# Altium schematic symbol library jlcpcb_2025_04_inductors_extended_0402.schlib: 1396 symbols (part 3 of 8) (continued)
## LQG15HS27NJ02D
designator L?  Inductance: 27nH
Inductor, 27nH, ±5%, 460mΩ, 350mA, SMD 0402; Manufacturer: Murata Electronics; Manufacturer Part Number: LQG15HS27NJ02D; Self-Resonant Frequency: 1.7GHz; Q Factor: 8@100MHz; Package Size: 0402; JLCPCB Basic Part: No; JLCPCB Part Number: C12669; Supplier 1: LCSC; Category: Inductors; Supplier Part Number 1: C12669; Tolerance: ±5%; Rated Current: 350mA; DC Resistance: 460mΩ; RoHS: Yes; ComponentLink1Description: Datasheet; ComponentLink1URL: https://wmsc.lcsc.com/wmsc/upload/file/pdf/v2/lcsc/2304140030_Murata-Electronics-LQG15HS27NJ02D_C12669.pdf; ComponentLink2Description: JLCPCB Part URL; ComponentLink2URL: https://jlcpcb.com/partdetail/C12669; ComponentLink3Description: LCSC Part URL; ComponentLink3URL: https://lcsc.com/product-detail/Inductors-SMD_Murata-Electronics-Murata-Electronics-LQG15HS27NJ02D_C12669.html
footprint IND-0402 (0402 (1005M) Inductor)
pins: 1, 2

## LQG15HS33NG02D
designator L?  Inductance: 33nH
Inductor, 33nH, ±2%, 580mΩ, 350mA, SMD 0402; Manufacturer: Murata Electronics; Manufacturer Part Number: LQG15HS33NG02D; Package Size: 0402; JLCPCB Basic Part: No; JLCPCB Part Number: C3910755; Supplier 1: LCSC; Category: Inductors; Supplier Part Number 1: C3910755; Tolerance: ±2%; Rated Current: 350mA; DC Resistance: 580mΩ; RoHS: Yes; ComponentLink1Description: Datasheet; ComponentLink1URL: https://wmsc.lcsc.com/wmsc/upload/file/pdf/v2/lcsc/2308111609_Murata-Electronics-LQG15HS33NG02D_C3910755.pdf; ComponentLink2Description: JLCPCB Part URL; ComponentLink2URL: https://jlcpcb.com/partdetail/C3910755; ComponentLink3Description: LCSC Part URL; ComponentLink3URL: https://lcsc.com/product-detail/Inductors-SMD_Murata-Electronics-Murata-Electronics-LQG15HS33NG02D_C3910755.html
footprint IND-0402 (0402 (1005M) Inductor)
pins: 1, 2

## LQG15HS33NJ02D
designator L?  Inductance: 33nH
Inductor, 33nH, ±5%, 580mΩ, 350mA, SMD 0402; Manufacturer: Murata Electronics; Manufacturer Part Number: LQG15HS33NJ02D; Self-Resonant Frequency: 1.6GHz; Q Factor: 8@100MHz; Package Size: 0402; JLCPCB Basic Part: No; JLCPCB Part Number: C86062; Supplier 1: LCSC; Category: Inductors; Supplier Part Number 1: C86062; Tolerance: ±5%; Rated Current: 350mA; DC Resistance: 580mΩ; RoHS: Yes; ComponentLink1Description: Datasheet; ComponentLink1URL: https://wmsc.lcsc.com/wmsc/upload/file/pdf/v2/lcsc/2304140030_Murata-Electronics-LQG15HS33NJ02D_C86062.pdf; ComponentLink2Description: JLCPCB Part URL; ComponentLink2URL: https://jlcpcb.com/partdetail/C86062; ComponentLink3Description: LCSC Part URL; ComponentLink3URL: https://lcsc.com/product-detail/Inductors-SMD_Murata-Electronics-Murata-Electronics-LQG15HS33NJ02D_C86062.html
footprint IND-0402 (0402 (1005M) Inductor)
pins: 1, 2

## LQG15HS39NJ02D
designator L?  Inductance: 39nH
Inductor, 39nH, ±5%, 650mΩ, 300mA, SMD 0402; Manufacturer: Murata Electronics; Manufacturer Part Number: LQG15HS39NJ02D; Self-Resonant Frequency: 1.2GHz; Q Factor: 8@100MHz; Package Size: 0402; JLCPCB Basic Part: No; JLCPCB Part Number: C86063; Supplier 1: LCSC; Category: Inductors; Supplier Part Number 1: C86063; Tolerance: ±5%; Rated Current: 300mA; DC Resistance: 650mΩ; RoHS: Yes; ComponentLink1Description: Datasheet; ComponentLink1URL: https://wmsc.lcsc.com/wmsc/upload/file/pdf/v2/lcsc/1811081612_Murata-Electronics-LQG15HS39NJ02D_C86063.pdf; ComponentLink2Description: JLCPCB Part URL; ComponentLink2URL: https://jlcpcb.com/partdetail/C86063; ComponentLink3Description: LCSC Part URL; ComponentLink3URL: https://lcsc.com/product-detail/Inductors-SMD_Murata-Electronics-Murata-Electronics-LQG15HS39NJ02D_C86063.html
footprint IND-0402 (0402 (1005M) Inductor)
pins: 1, 2

## LQG15HS47NJ02D
designator L?  Inductance: 47nH
Inductor, 47nH, ±5%, 720mΩ, 300mA, SMD 0402; Manufacturer: Murata Electronics; Manufacturer Part Number: LQG15HS47NJ02D; Self-Resonant Frequency: 1GHz; Q Factor: 8@100MHz; Package Size: 0402; JLCPCB Basic Part: No; JLCPCB Part Number: C97998; Supplier 1: LCSC; Category: Inductors; Supplier Part Number 1: C97998; Tolerance: ±5%; Rated Current: 300mA; DC Resistance: 720mΩ; RoHS: Yes; ComponentLink1Description: Datasheet; ComponentLink1URL: https://wmsc.lcsc.com/wmsc/upload/file/pdf/v2/lcsc/1811081515_Murata-Electronics-LQG15HS47NJ02D_C97998.pdf; ComponentLink2Description: JLCPCB Part URL; ComponentLink2URL: https://jlcpcb.com/partdetail/C97998; ComponentLink3Description: LCSC Part URL; ComponentLink3URL: https://lcsc.com/product-detail/Inductors-SMD_Murata-Electronics-Murata-Electronics-LQG15HS47NJ02D_C97998.html
footprint IND-0402 (0402 (1005M) Inductor)
pins: 1, 2

## LQG15HS56NJ02D
designator L?  Inductance: 56nH
Inductor, 56nH, ±5%, 820mΩ, 250mA, SMD 0402; Manufacturer: Murata Electronics; Manufacturer Part Number: LQG15HS56NJ02D; Self-Resonant Frequency: 800MHz; Q Factor: 8@100MHz; Package Size: 0402; JLCPCB Basic Part: No; JLCPCB Part Number: C162544; Supplier 1: LCSC; Category: Inductors; Supplier Part Number 1: C162544; Tolerance: ±5%; Rated Current: 250mA; DC Resistance: 820mΩ; RoHS: Yes; ComponentLink1Description: Datasheet; ComponentLink1URL: https://wmsc.lcsc.com/wmsc/upload/file/pdf/v2/lcsc/2304140030_Murata-Electronics-LQG15HS56NJ02D_C162544.pdf; ComponentLink2Description: JLCPCB Part URL; ComponentLink2URL: https://jlcpcb.com/partdetail/C162544; ComponentLink3Description: LCSC Part URL; ComponentLink3URL: https://lcsc.com/product-detail/Inductors-SMD_Murata-Electronics-Murata-Electronics-LQG15HS56NJ02D_C162544.html
footprint IND-0402 (0402 (1005M) Inductor)
pins: 1, 2

## LQG15HS68NJ02D
designator L?  Inductance: 68nH
Inductor, 68nH, ±5%, 920mΩ, 250mA, SMD 0402; Manufacturer: Murata Electronics; Manufacturer Part Number: LQG15HS68NJ02D; Self-Resonant Frequency: 800MHz; Q Factor: 8@100MHz; Package Size: 0402; JLCPCB Basic Part: No; JLCPCB Part Number: C98000; Supplier 1: LCSC; Category: Inductors; Supplier Part Number 1: C98000; Tolerance: ±5%; Rated Current: 250mA; DC Resistance: 920mΩ; RoHS: Yes; ComponentLink1Description: Datasheet; ComponentLink1URL: https://wmsc.lcsc.com/wmsc/upload/file/pdf/v2/lcsc/1811081524_Murata-Electronics-LQG15HS68NJ02D_C98000.pdf; ComponentLink2Description: JLCPCB Part URL; ComponentLink2URL: https://jlcpcb.com/partdetail/C98000; ComponentLink3Description: LCSC Part URL; ComponentLink3URL: https://lcsc.com/product-detail/Inductors-SMD_Murata-Electronics-Murata-Electronics-LQG15HS68NJ02D_C98000.html
footprint IND-0402 (0402 (1005M) Inductor)
pins: 1, 2

## LQG15HS82NJ02D
designator L?  Inductance: 82nH
Inductor, 82nH, ±5%, 1.2Ω, 200mA, SMD 0402; Manufacturer: Murata Electronics; Manufacturer Part Number: LQG15HS82NJ02D; Self-Resonant Frequency: 700MHz; Q Factor: 8@100MHz; Package Size: 0402; JLCPCB Basic Part: No; JLCPCB Part Number: C98002; Supplier 1: LCSC; Category: Inductors; Supplier Part Number 1: C98002; Tolerance: ±5%; Rated Current: 200mA; DC Resistance: 1.2Ω; RoHS: Yes; ComponentLink1Description: Datasheet; ComponentLink1URL: https://wmsc.lcsc.com/wmsc/upload/file/pdf/v2/lcsc/1811081532_Murata-Electronics-LQG15HS82NJ02D_C98002.pdf; ComponentLink2Description: JLCPCB Part URL; ComponentLink2URL: https://jlcpcb.com/partdetail/C98002; ComponentLink3Description: LCSC Part URL; ComponentLink3URL: https://lcsc.com/product-detail/Inductors-SMD_Murata-Electronics-Murata-Electronics-LQG15HS82NJ02D_C98002.html
footprint IND-0402 (0402 (1005M) Inductor)
pins: 1, 2

## LQG15HSR10H02D
designator L?  Inductance: 100nH
Inductor, 100nH, ±3%, 1.25Ω, 200mA, SMD 0402; Manufacturer: Murata Electronics; Manufacturer Part Number: LQG15HSR10H02D; Self-Resonant Frequency: 600MHz; Q Factor: 8@100MHz; Package Size: 0402; JLCPCB Basic Part: No; JLCPCB Part Number: C883578; Supplier 1: LCSC; Category: Inductors; Supplier Part Number 1: C883578; Tolerance: ±3%; Rated Current: 200mA; DC Resistance: 1.25Ω; RoHS: Yes; ComponentLink1Description: Datasheet; ComponentLink1URL: https://wmsc.lcsc.com/wmsc/upload/file/pdf/v2/lcsc/2201242100_Murata-Electronics-LQG15HSR10H02D_C883578.pdf; ComponentLink2Description: JLCPCB Part URL; ComponentLink2URL: https://jlcpcb.com/partdetail/C883578; ComponentLink3Description: LCSC Part URL; ComponentLink3URL: https://lcsc.com/product-detail/Inductors-SMD_Murata-Electronics-Murata-Electronics-LQG15HSR10H02D_C883578.html
footprint IND-0402 (0402 (1005M) Inductor)
pins: 1, 2

## LQG15HSR10J02D
designator L?  Inductance: 100nH
Inductor, 100nH, ±5%, 1.25Ω, 200mA, SMD 0402; Manufacturer: Murata Electronics; Manufacturer Part Number: LQG15HSR10J02D; Self-Resonant Frequency: 600MHz; Q Factor: 8@100MHz; Package Size: 0402; JLCPCB Basic Part: No; JLCPCB Part Number: C98004; Supplier 1: LCSC; Category: Inductors; Supplier Part Number 1: C98004; Tolerance: ±5%; Rated Current: 200mA; DC Resistance: 1.25Ω; RoHS: Yes; ComponentLink1Description: Datasheet; ComponentLink1URL: https://wmsc.lcsc.com/wmsc/upload/file/pdf/v2/lcsc/1811081524_Murata-Electronics-LQG15HSR10J02D_C98004.pdf; ComponentLink2Description: JLCPCB Part URL; ComponentLink2URL: https://jlcpcb.com/partdetail/C98004; ComponentLink3Description: LCSC Part URL; ComponentLink3URL: https://lcsc.com/product-detail/Inductors-SMD_Murata-Electronics-Murata-Electronics-LQG15HSR10J02D_C98004.html
footprint IND-0402 (0402 (1005M) Inductor)
pins: 1, 2

## LQG15HSR12J02D
designator L?  Inductance: 120nH
Inductor, 120nH, ±5%, 1.3Ω, 200mA, SMD 0402; Manufacturer: Murata Electronics; Manufacturer Part Number: LQG15HSR12J02D; Self-Resonant Frequency: 600MHz; Q Factor: 8@100MHz; Package Size: 0402; JLCPCB Basic Part: No; JLCPCB Part Number: C86067; Supplier 1: LCSC; Category: Inductors; Supplier Part Number 1: C86067; Tolerance: ±5%; Rated Current: 200mA; DC Resistance: 1.3Ω; RoHS: Yes; ComponentLink1Description: Datasheet; ComponentLink1URL: https://wmsc.lcsc.com/wmsc/upload/file/pdf/v2/lcsc/1811081614_Murata-Electronics-LQG15HSR12J02D_C86067.pdf; ComponentLink2Description: JLCPCB Part URL; ComponentLink2URL: https://jlcpcb.com/partdetail/C86067; ComponentLink3Description: LCSC Part URL; ComponentLink3URL: https://lcsc.com/product-detail/Inductors-SMD_Murata-Electronics-Murata-Electronics-LQG15HSR12J02D_C86067.html
footprint IND-0402 (0402 (1005M) Inductor)
pins: 1, 2

## LQG15HSR15J02D
designator L?  Inductance: 150nH
Inductor, 150nH, ±5%, 2.99Ω, 150mA, SMD 0402; Manufacturer: Murata Electronics; Manufacturer Part Number: LQG15HSR15J02D; Self-Resonant Frequency: 550MHz; Q Factor: 8@100MHz; Package Size: 0402; JLCPCB Basic Part: No; JLCPCB Part Number: C162548; Supplier 1: LCSC; Category: Inductors; Supplier Part Number 1: C162548; Tolerance: ±5%; Rated Current: 150mA; DC Resistance: 2.99Ω; RoHS: Yes; ComponentLink1Description: Datasheet; ComponentLink1URL: https://wmsc.lcsc.com/wmsc/upload/file/pdf/v2/lcsc/2304140030_Murata-Electronics-LQG15HSR15J02D_C162548.pdf; ComponentLink2Description: JLCPCB Part URL; ComponentLink2URL: https://jlcpcb.com/partdetail/C162548; ComponentLink3Description: LCSC Part URL; ComponentLink3URL: https://lcsc.com/product-detail/Inductors-SMD_Murata-Electronics-Murata-Electronics-LQG15HSR15J02D_C162548.html
footprint IND-0402 (0402 (1005M) Inductor)
pins: 1, 2

## LQG15HSR18J02D
designator L?  Inductance: 180nH
Inductor, 180nH, ±5%, 3.38Ω, 150mA, SMD 0402; Manufacturer: Murata Electronics; Manufacturer Part Number: LQG15HSR18J02D; Self-Resonant Frequency: 500MHz; Q Factor: 8@100MHz; Package Size: 0402; JLCPCB Basic Part: No; JLCPCB Part Number: C185484; Supplier 1: LCSC; Category: Inductors; Supplier Part Number 1: C185484; Tolerance: ±5%; Rated Current: 150mA; DC Resistance: 3.38Ω; RoHS: Yes; ComponentLink1Description: Datasheet; ComponentLink1URL: https://wmsc.lcsc.com/wmsc/upload/file/pdf/v2/lcsc/1811081534_Murata-Electronics-LQG15HSR18J02D_C185484.pdf; ComponentLink2Description: JLCPCB Part URL; ComponentLink2URL: https://jlcpcb.com/partdetail/C185484; ComponentLink3Description: LCSC Part URL; ComponentLink3URL: https://lcsc.com/product-detail/Inductors-SMD_Murata-Electronics-Murata-Electronics-LQG15HSR18J02D_C185484.html
footprint IND-0402 (0402 (1005M) Inductor)
pins: 1, 2

## LQG15HSR22J02D
designator L?  Inductance: 220nH
Inductor, 220nH, ±5%, 3.77Ω, 120mA, SMD 0402; Manufacturer: Murata Electronics; Manufacturer Part Number: LQG15HSR22J02D; Self-Resonant Frequency: 450MHz; Q Factor: 8@100MHz; Package Size: 0402; JLCPCB Basic Part: No; JLCPCB Part Number: C162549; Supplier 1: LCSC; Category: Inductors; Supplier Part Number 1: C162549; Tolerance: ±5%; Rated Current: 120mA; DC Resistance: 3.77Ω; RoHS: Yes; ComponentLink1Description: Datasheet; ComponentLink1URL: https://wmsc.lcsc.com/wmsc/upload/file/pdf/v2/lcsc/2304140030_Murata-Electronics-LQG15HSR22J02D_C162549.pdf; ComponentLink2Description: JLCPCB Part URL; ComponentLink2URL: https://jlcpcb.com/partdetail/C162549; ComponentLink3Description: LCSC Part URL; ComponentLink3URL: https://lcsc.com/product-detail/Inductors-SMD_Murata-Electronics-Murata-Electronics-LQG15HSR22J02D_C162549.html
footprint IND-0402 (0402 (1005M) Inductor)
pins: 1, 2

## LQG15HSR27J02D
designator L?  Inductance: 270nH
Inductor, 270nH, ±5%, 4.94Ω, 110mA, SMD 0402; Manufacturer: Murata Electronics; Manufacturer Part Number: LQG15HSR27J02D; Self-Resonant Frequency: 400MHz; Q Factor: 8@100MHz; Package Size: 0402; JLCPCB Basic Part: No; JLCPCB Part Number: C77111; Supplier 1: LCSC; Category: Inductors; Supplier Part Number 1: C77111; Tolerance: ±5%; Rated Current: 110mA; DC Resistance: 4.94Ω; RoHS: Yes; ComponentLink1Description: Datasheet; ComponentLink1URL: https://wmsc.lcsc.com/wmsc/upload/file/pdf/v2/lcsc/2304140030_Murata-Electronics-LQG15HSR27J02D_C77111.pdf; ComponentLink2Description: JLCPCB Part URL; ComponentLink2URL: https://jlcpcb.com/partdetail/C77111; ComponentLink3Description: LCSC Part URL; ComponentLink3URL: https://lcsc.com/product-detail/Inductors-SMD_Murata-Electronics-Murata-Electronics-LQG15HSR27J02D_C77111.html
footprint IND-0402 (0402 (1005M) Inductor)
pins: 1, 2

## LQG15HZ1N0S02D
designator L?  Inductance: 1nH
Inductor, 1nH, 70mΩ, 1A, SMD 0402; Manufacturer: Murata Electronics; Manufacturer Part Number: LQG15HZ1N0S02D; Self-Resonant Frequency: 10GHz; Q Factor: 8@100MHz; Package Size: 0402; JLCPCB Basic Part: No; JLCPCB Part Number: C1332586; Supplier 1: LCSC; Category: Inductors; Supplier Part Number 1: C1332586; Rated Current: 1A; DC Resistance: 70mΩ; RoHS: Yes; ComponentLink1Description: Datasheet; ComponentLink1URL: https://wmsc.lcsc.com/wmsc/upload/file/pdf/v2/lcsc/2304140030_Murata-Electronics-LQG15HZ1N0S02D_C1332586.pdf; ComponentLink2Description: JLCPCB Part URL; ComponentLink2URL: https://jlcpcb.com/partdetail/C1332586; ComponentLink3Description: LCSC Part URL; ComponentLink3URL: https://lcsc.com/product-detail/Inductors-SMD_Murata-Electronics-Murata-Electronics-LQG15HZ1N0S02D_C1332586.html
footprint IND-0402 (0402 (1005M) Inductor)
pins: 1, 2

## LQG15HZ2N0C02D
designator L?  Inductance: 2nH
Inductor, 2nH, 90mΩ, 900mA, SMD 0402; Manufacturer: Murata Electronics; Manufacturer Part Number: LQG15HZ2N0C02D; Self-Resonant Frequency: 6GHz; Q Factor: 8@100MHz; Package Size: 0402; JLCPCB Basic Part: No; JLCPCB Part Number: C2043575; Supplier 1: LCSC; Category: Inductors; Supplier Part Number 1: C2043575; Rated Current: 900mA; DC Resistance: 90mΩ; RoHS: Yes; ComponentLink1Description: Datasheet; ComponentLink1URL: https://wmsc.lcsc.com/wmsc/upload/file/pdf/v2/lcsc/2304140030_Murata-Electronics-LQG15HZ2N0C02D_C2043575.pdf; ComponentLink2Description: JLCPCB Part URL; ComponentLink2URL: https://jlcpcb.com/partdetail/C2043575; ComponentLink3Description: LCSC Part URL; ComponentLink3URL: https://lcsc.com/product-detail/Inductors-SMD_Murata-Electronics-Murata-Electronics-LQG15HZ2N0C02D_C2043575.html
footprint IND-0402 (0402 (1005M) Inductor)
pins: 1, 2

## LQG15HZ2N0S02D
designator L?  Inductance: 2nH
Inductor, 2nH, 90mΩ, 900mA, SMD 0402; Manufacturer: Murata Electronics; Manufacturer Part Number: LQG15HZ2N0S02D; Self-Resonant Frequency: 6GHz; Q Factor: 8@100MHz; Package Size: 0402; JLCPCB Basic Part: No; JLCPCB Part Number: C1330472; Supplier 1: LCSC; Category: Inductors; Supplier Part Number 1: C1330472; Rated Current: 900mA; DC Resistance: 90mΩ; RoHS: Yes; ComponentLink1Description: Datasheet; ComponentLink1URL: https://wmsc.lcsc.com/wmsc/upload/file/pdf/v2/lcsc/2304140030_Murata-Electronics-LQG15HZ2N0S02D_C1330472.pdf; ComponentLink2Description: JLCPCB Part URL; ComponentLink2URL: https://jlcpcb.com/partdetail/C1330472; ComponentLink3Description: LCSC Part URL; ComponentLink3URL: https://lcsc.com/product-detail/Inductors-SMD_Murata-Electronics-Murata-Electronics-LQG15HZ2N0S02D_C1330472.html
footprint IND-0402 (0402 (1005M) Inductor)
pins: 1, 2

## LQG15HZ3N0C02D
designator L?  Inductance: 3nH
Inductor, 3nH, 125mΩ, 800mA, SMD 0402; Manufacturer: Murata Electronics; Manufacturer Part Number: LQG15HZ3N0C02D; Self-Resonant Frequency: 6GHz; Q Factor: 8@100MHz; Package Size: 0402; JLCPCB Basic Part: No; JLCPCB Part Number: C2043501; Supplier 1: LCSC; Category: Inductors; Supplier Part Number 1: C2043501; Rated Current: 800mA; DC Resistance: 125mΩ; RoHS: Yes; ComponentLink1Description: Datasheet; ComponentLink1URL: https://wmsc.lcsc.com/wmsc/upload/file/pdf/v2/lcsc/2304140030_Murata-Electronics-LQG15HZ3N0C02D_C2043501.pdf; ComponentLink2Description: JLCPCB Part URL; ComponentLink2URL: https://jlcpcb.com/partdetail/C2043501; ComponentLink3Description: LCSC Part URL; ComponentLink3URL: https://lcsc.com/product-detail/Inductors-SMD_Murata-Electronics-Murata-Electronics-LQG15HZ3N0C02D_C2043501.html
footprint IND-0402 (0402 (1005M) Inductor)
pins: 1, 2

## LQG15HZ3N0S02D
designator L?  Inductance: 3nH
Inductor, 3nH, 125mΩ, 800mA, SMD 0402; Manufacturer: Murata Electronics; Manufacturer Part Number: LQG15HZ3N0S02D; Self-Resonant Frequency: 6GHz; Q Factor: 8@100MHz; Package Size: 0402; JLCPCB Basic Part: No; JLCPCB Part Number: C1332556; Supplier 1: LCSC; Category: Inductors; Supplier Part Number 1: C1332556; Rated Current: 800mA; DC Resistance: 125mΩ; RoHS: Yes; ComponentLink1Description: Datasheet; ComponentLink1URL: https://wmsc.lcsc.com/wmsc/upload/file/pdf/v2/lcsc/2304140030_Murata-Electronics-LQG15HZ3N0S02D_C1332556.pdf; ComponentLink2Description: JLCPCB Part URL; ComponentLink2URL: https://jlcpcb.com/partdetail/C1332556; ComponentLink3Description: LCSC Part URL; ComponentLink3URL: https://lcsc.com/product-detail/Inductors-SMD_Murata-Electronics-Murata-Electronics-LQG15HZ3N0S02D_C1332556.html
footprint IND-0402 (0402 (1005M) Inductor)
pins: 1, 2

## LQG15HZ3N3S02D
designator L?  Inductance: 3.3nH
Inductor, 3.3nH, 125mΩ, 800mA, SMD 0402; Manufacturer: Murata Electronics; Manufacturer Part Number: LQG15HZ3N3S02D; Self-Resonant Frequency: 6GHz; Q Factor: 8@100MHz; Package Size: 0402; JLCPCB Basic Part: No; JLCPCB Part Number: C1332565; Supplier 1: LCSC; Category: Inductors; Supplier Part Number 1: C1332565; Rated Current: 800mA; DC Resistance: 125mΩ; RoHS: Yes; ComponentLink1Description: Datasheet; ComponentLink1URL: https://wmsc.lcsc.com/wmsc/upload/file/pdf/v2/lcsc/2304140030_Murata-Electronics-LQG15HZ3N3S02D_C1332565.pdf; ComponentLink2Description: JLCPCB Part URL; ComponentLink2URL: https://jlcpcb.com/partdetail/C1332565; ComponentLink3Description: LCSC Part URL; ComponentLink3URL: https://lcsc.com/product-detail/Inductors-SMD_Murata-Electronics-Murata-Electronics-LQG15HZ3N3S02D_C1332565.html
footprint IND-0402 (0402 (1005M) Inductor)
pins: 1, 2

## LQG15HZ5N6B02D
designator L?  Inductance: 5.6nH
Inductor, 5.6nH, 180mΩ, SMD 0402; Manufacturer: Murata Electronics; Manufacturer Part Number: LQG15HZ5N6B02D; Self-Resonant Frequency: 4.5GHz; Q Factor: 8@100MHz; Package Size: 0402; JLCPCB Basic Part: No; JLCPCB Part Number: C408154; Supplier 1: LCSC; Category: Inductors; Supplier Part Number 1: C408154; DC Resistance: 180mΩ; RoHS: Yes; ComponentLink1Description: Datasheet; ComponentLink1URL: https://wmsc.lcsc.com/wmsc/upload/file/pdf/v2/lcsc/1912111437_Murata-Electronics-LQG15HZ5N6B02D_C408154.pdf; ComponentLink2Description: JLCPCB Part URL; ComponentLink2URL: https://jlcpcb.com/partdetail/C408154; ComponentLink3Description: LCSC Part URL; ComponentLink3URL: https://lcsc.com/product-detail/Inductors-SMD_Murata-Electronics-Murata-Electronics-LQG15HZ5N6B02D_C408154.html
footprint IND-0402 (0402 (1005M) Inductor)
pins: 1, 2

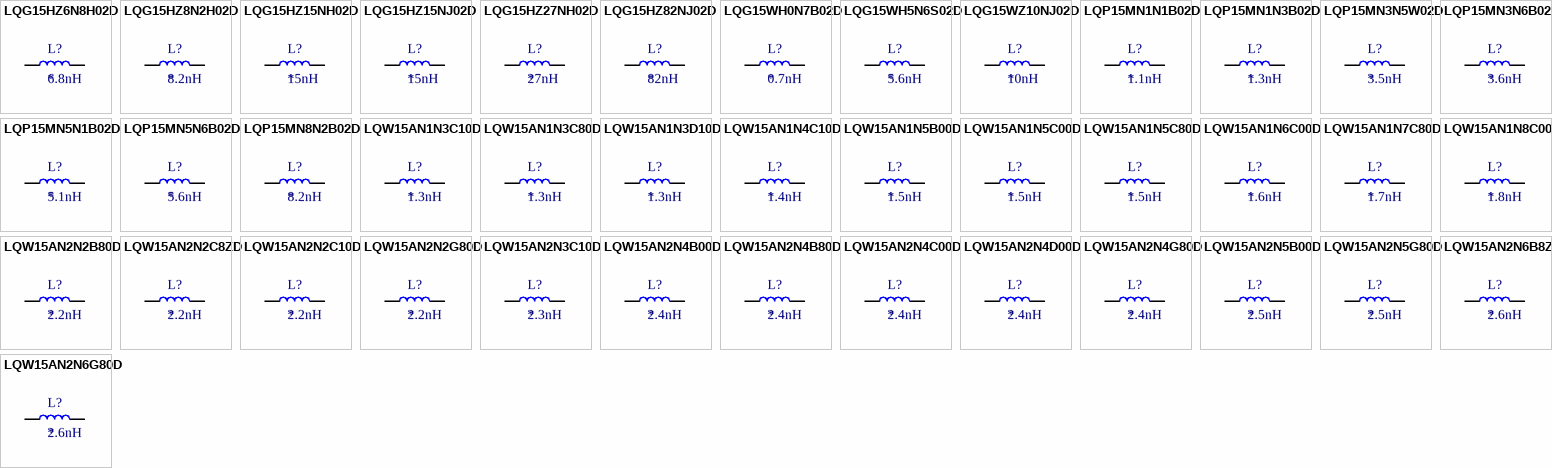
[diagram p11: symbols LQG15HZ6N8H02D to LQW15AN2N6G80D]

## LQG15HZ6N8H02D
designator L?  Inductance: 6.8nH
Inductor, 6.8nH, ±3%, 220mΩ, 600mA, SMD 0402; Manufacturer: Murata Electronics; Manufacturer Part Number: LQG15HZ6N8H02D; Self-Resonant Frequency: 4.5GHz; Q Factor: 8@100MHz; Package Size: 0402; JLCPCB Basic Part: No; JLCPCB Part Number: C193678; Supplier 1: LCSC; Category: Inductors; Supplier Part Number 1: C193678; Tolerance: ±3%; Rated Current: 600mA; DC Resistance: 220mΩ; RoHS: Yes; ComponentLink1Description: Datasheet; ComponentLink1URL: https://wmsc.lcsc.com/wmsc/upload/file/pdf/v2/lcsc/2304140030_Murata-Electronics-LQG15HZ6N8H02D_C193678.pdf; ComponentLink2Description: JLCPCB Part URL; ComponentLink2URL: https://jlcpcb.com/partdetail/C193678; ComponentLink3Description: LCSC Part URL; ComponentLink3URL: https://lcsc.com/product-detail/Inductors-SMD_Murata-Electronics-Murata-Electronics-LQG15HZ6N8H02D_C193678.html
footprint IND-0402 (0402 (1005M) Inductor)
pins: 1, 2

## LQG15HZ8N2H02D
designator L?  Inductance: 8.2nH
Inductor, 8.2nH, ±3%, 240mΩ, 550mA, SMD 0402; Manufacturer: Murata Electronics; Manufacturer Part Number: LQG15HZ8N2H02D; Self-Resonant Frequency: 3.7GHz; Q Factor: 8@100MHz; Package Size: 0402; JLCPCB Basic Part: No; JLCPCB Part Number: C2044364; Supplier 1: LCSC; Category: Inductors; Supplier Part Number 1: C2044364; Tolerance: ±3%; Rated Current: 550mA; DC Resistance: 240mΩ; RoHS: Yes; ComponentLink1Description: Datasheet; ComponentLink1URL: https://wmsc.lcsc.com/wmsc/upload/file/pdf/v2/lcsc/2304140030_Murata-Electronics-LQG15HZ8N2H02D_C2044364.pdf; ComponentLink2Description: JLCPCB Part URL; ComponentLink2URL: https://jlcpcb.com/partdetail/C2044364; ComponentLink3Description: LCSC Part URL; ComponentLink3URL: https://lcsc.com/product-detail/Inductors-SMD_Murata-Electronics-Murata-Electronics-LQG15HZ8N2H02D_C2044364.html
footprint IND-0402 (0402 (1005M) Inductor)
pins: 1, 2

## LQG15HZ15NH02D
designator L?  Inductance: 15nH
Inductor, 15nH, ±3%, 320mΩ, 450mA, SMD 0402; Manufacturer: Murata Electronics; Manufacturer Part Number: LQG15HZ15NH02D; Self-Resonant Frequency: 2.5GHz; Q Factor: 8@100MHz; Package Size: 0402; JLCPCB Basic Part: No; JLCPCB Part Number: C1330450; Supplier 1: LCSC; Category: Inductors; Supplier Part Number 1: C1330450; Tolerance: ±3%; Rated Current: 450mA; DC Resistance: 320mΩ; RoHS: Yes; ComponentLink1Description: Datasheet; ComponentLink1URL: https://wmsc.lcsc.com/wmsc/upload/file/pdf/v2/lcsc/2304140030_Murata-Electronics-LQG15HZ15NH02D_C1330450.pdf; ComponentLink2Description: JLCPCB Part URL; ComponentLink2URL: https://jlcpcb.com/partdetail/C1330450; ComponentLink3Description: LCSC Part URL; ComponentLink3URL: https://lcsc.com/product-detail/Inductors-SMD_Murata-Electronics-Murata-Electronics-LQG15HZ15NH02D_C1330450.html
footprint IND-0402 (0402 (1005M) Inductor)
pins: 1, 2

## LQG15HZ15NJ02D
designator L?  Inductance: 15nH
Inductor, 15nH, ±5%, 320mΩ, 450mA, SMD 0402; Manufacturer: Murata Electronics; Manufacturer Part Number: LQG15HZ15NJ02D; Self-Resonant Frequency: 2.5GHz; Q Factor: 8@100MHz; Package Size: 0402; JLCPCB Basic Part: No; JLCPCB Part Number: C883544; Supplier 1: LCSC; Category: Inductors; Supplier Part Number 1: C883544; Tolerance: ±5%; Rated Current: 450mA; DC Resistance: 320mΩ; RoHS: Yes; ComponentLink1Description: Datasheet; ComponentLink1URL: https://wmsc.lcsc.com/wmsc/upload/file/pdf/v2/lcsc/2304140030_Murata-Electronics-LQG15HZ15NJ02D_C883544.pdf; ComponentLink2Description: JLCPCB Part URL; ComponentLink2URL: https://jlcpcb.com/partdetail/C883544; ComponentLink3Description: LCSC Part URL; ComponentLink3URL: https://lcsc.com/product-detail/Inductors-SMD_Murata-Electronics-Murata-Electronics-LQG15HZ15NJ02D_C883544.html
footprint IND-0402 (0402 (1005M) Inductor)
pins: 1, 2

## LQG15HZ27NH02D
designator L?  Inductance: 27nH
Inductor, 27nH, ±3%, 460mΩ, 350mA, SMD 0402; Manufacturer: Murata Electronics; Manufacturer Part Number: LQG15HZ27NH02D; Self-Resonant Frequency: 1.7GHz; Q Factor: 8@100MHz; Package Size: 0402; JLCPCB Basic Part: No; JLCPCB Part Number: C237452; Supplier 1: LCSC; Category: Inductors; Supplier Part Number 1: C237452; Tolerance: ±3%; Rated Current: 350mA; DC Resistance: 460mΩ; RoHS: Yes; ComponentLink1Description: Datasheet; ComponentLink1URL: https://wmsc.lcsc.com/wmsc/upload/file/pdf/v2/lcsc/2304140030_Murata-Electronics-LQG15HZ27NH02D_C237452.pdf; ComponentLink2Description: JLCPCB Part URL; ComponentLink2URL: https://jlcpcb.com/partdetail/C237452; ComponentLink3Description: LCSC Part URL; ComponentLink3URL: https://lcsc.com/product-detail/Inductors-SMD_Murata-Electronics-Murata-Electronics-LQG15HZ27NH02D_C237452.html
footprint IND-0402 (0402 (1005M) Inductor)
pins: 1, 2

## LQG15HZ82NJ02D
designator L?  Inductance: 82nH
Inductor, 82nH, ±5%, 1.2Ω, 200mA, SMD 0402; Manufacturer: Murata Electronics; Manufacturer Part Number: LQG15HZ82NJ02D; Self-Resonant Frequency: 700MHz; Q Factor: 8@100MHz; Package Size: 0402; JLCPCB Basic Part: No; JLCPCB Part Number: C521063; Supplier 1: LCSC; Category: Inductors; Supplier Part Number 1: C521063; Tolerance: ±5%; Rated Current: 200mA; DC Resistance: 1.2Ω; RoHS: Yes; ComponentLink1Description: Datasheet; ComponentLink1URL: https://wmsc.lcsc.com/wmsc/upload/file/pdf/v2/lcsc/2304140030_Murata-Electronics-LQG15HZ82NJ02D_C521063.pdf; ComponentLink2Description: JLCPCB Part URL; ComponentLink2URL: https://jlcpcb.com/partdetail/C521063; ComponentLink3Description: LCSC Part URL; ComponentLink3URL: https://lcsc.com/product-detail/Inductors-SMD_Murata-Electronics-Murata-Electronics-LQG15HZ82NJ02D_C521063.html
footprint IND-0402 (0402 (1005M) Inductor)
pins: 1, 2

## LQG15WH0N7B02D
designator L?  Inductance: 0.7nH
Inductor, 0.7nH, 30mΩ, 1.2A, SMD 0402; Manufacturer: Murata Electronics; Manufacturer Part Number: LQG15WH0N7B02D; Self-Resonant Frequency: 15GHz; Package Size: 0402; JLCPCB Basic Part: No; JLCPCB Part Number: C1012762; Supplier 1: LCSC; Category: Inductors; Supplier Part Number 1: C1012762; Rated Current: 1.2A; DC Resistance: 30mΩ; RoHS: Yes; ComponentLink1Description: Datasheet; ComponentLink1URL: https://wmsc.lcsc.com/wmsc/upload/file/pdf/v2/lcsc/2304140030_Murata-Electronics-LQG15WH0N7B02D_C1012762.pdf; ComponentLink2Description: JLCPCB Part URL; ComponentLink2URL: https://jlcpcb.com/partdetail/C1012762; ComponentLink3Description: LCSC Part URL; ComponentLink3URL: https://lcsc.com/product-detail/Inductors-SMD_Murata-Electronics-Murata-Electronics-LQG15WH0N7B02D_C1012762.html
footprint IND-0402 (0402 (1005M) Inductor)
pins: 1, 2

## LQG15WH5N6S02D
designator L?  Inductance: 5.6nH
Inductor, 5.6nH, 130mΩ, 800mA, SMD 0402; Manufacturer: Murata Electronics; Manufacturer Part Number: LQG15WH5N6S02D; Self-Resonant Frequency: 4.5GHz; Q Factor: 23@250MHz; Package Size: 0402; JLCPCB Basic Part: No; JLCPCB Part Number: C560041; Supplier 1: LCSC; Category: Inductors; Supplier Part Number 1: C560041; Rated Current: 800mA; DC Resistance: 130mΩ; RoHS: Yes; ComponentLink1Description: Datasheet; ComponentLink1URL: https://wmsc.lcsc.com/wmsc/upload/file/pdf/v2/lcsc/2007221833_Murata-Electronics-LQG15WH5N6S02D_C560041.pdf; ComponentLink2Description: JLCPCB Part URL; ComponentLink2URL: https://jlcpcb.com/partdetail/C560041; ComponentLink3Description: LCSC Part URL; ComponentLink3URL: https://lcsc.com/product-detail/Inductors-SMD_Murata-Electronics-Murata-Electronics-LQG15WH5N6S02D_C560041.html
footprint IND-0402 (0402 (1005M) Inductor)
pins: 1, 2

## LQG15WZ10NJ02D
designator L?  Inductance: 10nH
Inductor, 10nH, ±5%, 190mΩ, 500mA, SMD 0402; Manufacturer: Murata Electronics; Manufacturer Part Number: LQG15WZ10NJ02D; Self-Resonant Frequency: 3.3GHz; Package Size: 0402; JLCPCB Basic Part: No; JLCPCB Part Number: C3911026; Supplier 1: LCSC; Category: Inductors; Supplier Part Number 1: C3911026; Tolerance: ±5%; Rated Current: 500mA; DC Resistance: 190mΩ; RoHS: Yes; ComponentLink1Description: Datasheet; ComponentLink1URL: https://wmsc.lcsc.com/wmsc/upload/file/pdf/v2/lcsc/2308111427_Murata-Electronics-LQG15WZ10NJ02D_C3911026.pdf; ComponentLink2Description: JLCPCB Part URL; ComponentLink2URL: https://jlcpcb.com/partdetail/C3911026; ComponentLink3Description: LCSC Part URL; ComponentLink3URL: https://lcsc.com/product-detail/Inductors-SMD_Murata-Electronics-Murata-Electronics-LQG15WZ10NJ02D_C3911026.html
footprint IND-0402 (0402 (1005M) Inductor)
pins: 1, 2

## LQP15MN1N1B02D
designator L?  Inductance: 1.1nH
Inductor, 1.1nH, 100mΩ, 390mA, SMD 0402; Manufacturer: Murata Electronics; Manufacturer Part Number: LQP15MN1N1B02D; Q Factor: 13@500MHz; Package Size: 0402; JLCPCB Basic Part: No; JLCPCB Part Number: C113106; Supplier 1: LCSC; Category: Inductors; Supplier Part Number 1: C113106; Rated Current: 390mA; DC Resistance: 100mΩ; RoHS: Yes; ComponentLink1Description: Datasheet; ComponentLink1URL: https://wmsc.lcsc.com/wmsc/upload/file/pdf/v2/lcsc/2304140030_Murata-Electronics-LQP15MN1N1B02D_C113106.pdf; ComponentLink2Description: JLCPCB Part URL; ComponentLink2URL: https://jlcpcb.com/partdetail/C113106; ComponentLink3Description: LCSC Part URL; ComponentLink3URL: https://lcsc.com/product-detail/Inductors-SMD_Murata-Electronics-Murata-Electronics-LQP15MN1N1B02D_C113106.html
footprint IND-0402 (0402 (1005M) Inductor)
pins: 1, 2

## LQP15MN1N3B02D
designator L?  Inductance: 1.3nH
Inductor, 1.3nH, 200mΩ, 280mA, SMD 0402; Manufacturer: Murata Electronics; Manufacturer Part Number: LQP15MN1N3B02D; Self-Resonant Frequency: 500MHz; Q Factor: 13@500MHz; Package Size: 0402; JLCPCB Basic Part: No; JLCPCB Part Number: C98049; Supplier 1: LCSC; Category: Inductors; Supplier Part Number 1: C98049; Rated Current: 280mA; DC Resistance: 200mΩ; RoHS: Yes; ComponentLink1Description: Datasheet; ComponentLink1URL: https://wmsc.lcsc.com/wmsc/upload/file/pdf/v2/lcsc/2304140030_Murata-Electronics-LQP15MN1N3B02D_C98049.pdf; ComponentLink2Description: JLCPCB Part URL; ComponentLink2URL: https://jlcpcb.com/partdetail/C98049; ComponentLink3Description: LCSC Part URL; ComponentLink3URL: https://lcsc.com/product-detail/Inductors-SMD_Murata-Electronics-Murata-Electronics-LQP15MN1N3B02D_C98049.html
footprint IND-0402 (0402 (1005M) Inductor)
pins: 1, 2

## LQP15MN3N5W02D
designator L?  Inductance: 3.5nH
Inductor, 3.5nH, 500mΩ, 170mA, SMD 0402; Manufacturer: Murata Electronics; Manufacturer Part Number: LQP15MN3N5W02D; Self-Resonant Frequency: 6GHz; Q Factor: 13@500MHz; Package Size: 0402; JLCPCB Basic Part: No; JLCPCB Part Number: C206462; Supplier 1: LCSC; Category: Inductors; Supplier Part Number 1: C206462; Rated Current: 170mA; DC Resistance: 500mΩ; RoHS: Yes; ComponentLink1Description: Datasheet; ComponentLink1URL: https://wmsc.lcsc.com/wmsc/upload/file/pdf/v2/lcsc/1912111437_Murata-Electronics-LQP15MN3N5W02D_C206462.pdf; ComponentLink2Description: JLCPCB Part URL; ComponentLink2URL: https://jlcpcb.com/partdetail/C206462; ComponentLink3Description: LCSC Part URL; ComponentLink3URL: https://lcsc.com/product-detail/Inductors-SMD_Murata-Electronics-Murata-Electronics-LQP15MN3N5W02D_C206462.html
footprint IND-0402 (0402 (1005M) Inductor)
pins: 1, 2

## LQP15MN3N6B02D
designator L?  Inductance: 3.6nH
Inductor, 3.6nH, 500mΩ, 170mA, SMD 0402; Manufacturer: Murata Electronics; Manufacturer Part Number: LQP15MN3N6B02D; Self-Resonant Frequency: 6GHz; Q Factor: 13@500MHz; Package Size: 0402; JLCPCB Basic Part: No; JLCPCB Part Number: C23770; Supplier 1: LCSC; Category: Inductors; Supplier Part Number 1: C23770; Rated Current: 170mA; DC Resistance: 500mΩ; RoHS: Yes; ComponentLink1Description: Datasheet; ComponentLink1URL: https://wmsc.lcsc.com/wmsc/upload/file/pdf/v2/lcsc/1811081610_Murata-Electronics-LQP15MN3N6B02D_C23770.pdf; ComponentLink2Description: JLCPCB Part URL; ComponentLink2URL: https://jlcpcb.com/partdetail/C23770; ComponentLink3Description: LCSC Part URL; ComponentLink3URL: https://lcsc.com/product-detail/Inductors-SMD_Murata-Electronics-Murata-Electronics-LQP15MN3N6B02D_C23770.html
footprint IND-0402 (0402 (1005M) Inductor)
pins: 1, 2

## LQP15MN5N1B02D
designator L?  Inductance: 5.1nH
Inductor, 5.1nH, 700mΩ, 140mA, SMD 0402; Manufacturer: Murata Electronics; Manufacturer Part Number: LQP15MN5N1B02D; Self-Resonant Frequency: 6GHz; Q Factor: 13@500MHz; Package Size: 0402; JLCPCB Basic Part: No; JLCPCB Part Number: C113107; Supplier 1: LCSC; Category: Inductors; Supplier Part Number 1: C113107; Rated Current: 140mA; DC Resistance: 700mΩ; RoHS: Yes; ComponentLink1Description: Datasheet; ComponentLink1URL: https://wmsc.lcsc.com/wmsc/upload/file/pdf/v2/lcsc/2304140030_Murata-Electronics-LQP15MN5N1B02D_C113107.pdf; ComponentLink2Description: JLCPCB Part URL; ComponentLink2URL: https://jlcpcb.com/partdetail/C113107; ComponentLink3Description: LCSC Part URL; ComponentLink3URL: https://lcsc.com/product-detail/Inductors-SMD_Murata-Electronics-Murata-Electronics-LQP15MN5N1B02D_C113107.html
footprint IND-0402 (0402 (1005M) Inductor)
pins: 1, 2

## LQP15MN5N6B02D
designator L?  Inductance: 5.6nH
Inductor, 5.6nH, 700mΩ, 140mA, SMD 0402; Manufacturer: Murata Electronics; Manufacturer Part Number: LQP15MN5N6B02D; Self-Resonant Frequency: 6GHz; Q Factor: 13@500MHz; Package Size: 0402; JLCPCB Basic Part: No; JLCPCB Part Number: C12667; Supplier 1: LCSC; Category: Inductors; Supplier Part Number 1: C12667; Rated Current: 140mA; DC Resistance: 700mΩ; RoHS: Yes; ComponentLink1Description: Datasheet; ComponentLink1URL: https://wmsc.lcsc.com/wmsc/upload/file/pdf/v2/lcsc/2304140030_Murata-Electronics-LQP15MN5N6B02D_C12667.pdf; ComponentLink2Description: JLCPCB Part URL; ComponentLink2URL: https://jlcpcb.com/partdetail/C12667; ComponentLink3Description: LCSC Part URL; ComponentLink3URL: https://lcsc.com/product-detail/Inductors-SMD_Murata-Electronics-Murata-Electronics-LQP15MN5N6B02D_C12667.html
footprint IND-0402 (0402 (1005M) Inductor)
pins: 1, 2

## LQP15MN8N2B02D
designator L?  Inductance: 8.2nH
Inductor, 8.2nH, 1.1Ω, 110mA, SMD 0402; Manufacturer: Murata Electronics; Manufacturer Part Number: LQP15MN8N2B02D; Self-Resonant Frequency: 5.5GHz; Q Factor: 13@500MHz; Package Size: 0402; JLCPCB Basic Part: No; JLCPCB Part Number: C98054; Supplier 1: LCSC; Category: Inductors; Supplier Part Number 1: C98054; Rated Current: 110mA; DC Resistance: 1.1Ω; RoHS: Yes; ComponentLink1Description: Datasheet; ComponentLink1URL: https://wmsc.lcsc.com/wmsc/upload/file/pdf/v2/lcsc/2304140030_Murata-Electronics-LQP15MN8N2B02D_C98054.pdf; ComponentLink2Description: JLCPCB Part URL; ComponentLink2URL: https://jlcpcb.com/partdetail/C98054; ComponentLink3Description: LCSC Part URL; ComponentLink3URL: https://lcsc.com/product-detail/Inductors-SMD_Murata-Electronics-Murata-Electronics-LQP15MN8N2B02D_C98054.html
footprint IND-0402 (0402 (1005M) Inductor)
pins: 1, 2

## LQW15AN1N3C10D
designator L?  Inductance: 1.3nH
Inductor, 1.3nH, 17mΩ, SMD 0402; Manufacturer: Murata Electronics; Manufacturer Part Number: LQW15AN1N3C10D; Self-Resonant Frequency: 16GHz; Q Factor: 20@250MHz; Package Size: 0402; JLCPCB Basic Part: No; JLCPCB Part Number: C91238; Supplier 1: LCSC; Category: Inductors; Supplier Part Number 1: C91238; DC Resistance: 17mΩ; RoHS: Yes; ComponentLink1Description: Datasheet; ComponentLink1URL: https://wmsc.lcsc.com/wmsc/upload/file/pdf/v2/lcsc/1811081524_Murata-Electronics-LQW15AN1N3C10D_C91238.pdf; ComponentLink2Description: JLCPCB Part URL; ComponentLink2URL: https://jlcpcb.com/partdetail/C91238; ComponentLink3Description: LCSC Part URL; ComponentLink3URL: https://lcsc.com/product-detail/Inductors-SMD_Murata-Electronics-Murata-Electronics-LQW15AN1N3C10D_C91238.html
footprint IND-0402 (0402 (1005M) Inductor)
pins: 1, 2

## LQW15AN1N3C80D
designator L?  Inductance: 1.3nH
Inductor, 1.3nH, 12mΩ, 3.15A, SMD 0402; Manufacturer: Murata Electronics; Manufacturer Part Number: LQW15AN1N3C80D; Self-Resonant Frequency: 18GHz; Q Factor: 20@250MHz; Package Size: 0402; JLCPCB Basic Part: No; JLCPCB Part Number: C412260; Supplier 1: LCSC; Category: Inductors; Supplier Part Number 1: C412260; Rated Current: 3.15A; DC Resistance: 12mΩ; RoHS: Yes; ComponentLink1Description: Datasheet; ComponentLink1URL: https://wmsc.lcsc.com/wmsc/upload/file/pdf/v2/lcsc/2304140030_Murata-Electronics-LQW15AN1N3C80D_C412260.pdf; ComponentLink2Description: JLCPCB Part URL; ComponentLink2URL: https://jlcpcb.com/partdetail/C412260; ComponentLink3Description: LCSC Part URL; ComponentLink3URL: https://lcsc.com/product-detail/Inductors-SMD_Murata-Electronics-Murata-Electronics-LQW15AN1N3C80D_C412260.html
footprint IND-0402 (0402 (1005M) Inductor)
pins: 1, 2

## LQW15AN1N3D10D
designator L?  Inductance: 1.3nH
Inductor, 1.3nH, 17mΩ, 1.2A, SMD 0402; Manufacturer: Murata Electronics; Manufacturer Part Number: LQW15AN1N3D10D; Package Size: 0402; JLCPCB Basic Part: No; JLCPCB Part Number: C913667; Supplier 1: LCSC; Category: Inductors; Supplier Part Number 1: C913667; Rated Current: 1.2A; DC Resistance: 17mΩ; RoHS: Yes; ComponentLink1Description: Datasheet; ComponentLink1URL: https://wmsc.lcsc.com/wmsc/upload/file/pdf/v2/lcsc/2201131300_Murata-Electronics-LQW15AN1N3D10D_C913667.pdf; ComponentLink2Description: JLCPCB Part URL; ComponentLink2URL: https://jlcpcb.com/partdetail/C913667; ComponentLink3Description: LCSC Part URL; ComponentLink3URL: https://lcsc.com/product-detail/Power-Inductors_Murata-Electronics-Murata-Electronics-LQW15AN1N3D10D_C913667.html
footprint IND-0402 (0402 (1005M) Inductor)
pins: 1, 2

## LQW15AN1N4C10D
designator L?  Inductance: 1.4nH
Inductor, 1.4nH, 19mΩ, SMD 0402; Manufacturer: Murata Electronics; Manufacturer Part Number: LQW15AN1N4C10D; Self-Resonant Frequency: 15GHz; Q Factor: 25@250MHz; Package Size: 0402; JLCPCB Basic Part: No; JLCPCB Part Number: C412339; Supplier 1: LCSC; Category: Inductors; Supplier Part Number 1: C412339; DC Resistance: 19mΩ; RoHS: Yes; ComponentLink1Description: Datasheet; ComponentLink1URL: https://wmsc.lcsc.com/wmsc/upload/file/pdf/v2/lcsc/2304140030_Murata-Electronics-LQW15AN1N4C10D_C412339.pdf; ComponentLink2Description: JLCPCB Part URL; ComponentLink2URL: https://jlcpcb.com/partdetail/C412339; ComponentLink3Description: LCSC Part URL; ComponentLink3URL: https://lcsc.com/product-detail/Inductors-SMD_Murata-Electronics-Murata-Electronics-LQW15AN1N4C10D_C412339.html
footprint IND-0402 (0402 (1005M) Inductor)
pins: 1, 2

## LQW15AN1N5B00D
designator L?  Inductance: 1.5nH
Inductor, 1.5nH, 30mΩ, SMD 0402; Manufacturer: Murata Electronics; Manufacturer Part Number: LQW15AN1N5B00D; Self-Resonant Frequency: 18GHz; Q Factor: 10@250MHz; Package Size: 0402; JLCPCB Basic Part: No; JLCPCB Part Number: C18221; Supplier 1: LCSC; Category: Inductors; Supplier Part Number 1: C18221; DC Resistance: 30mΩ; RoHS: Yes; ComponentLink1Description: Datasheet; ComponentLink1URL: https://wmsc.lcsc.com/wmsc/upload/file/pdf/v2/lcsc/2304140030_Murata-Electronics-LQW15AN1N5B00D_C18221.pdf; ComponentLink2Description: JLCPCB Part URL; ComponentLink2URL: https://jlcpcb.com/partdetail/C18221; ComponentLink3Description: LCSC Part URL; ComponentLink3URL: https://lcsc.com/product-detail/Inductors-SMD_Murata-Electronics-Murata-Electronics-LQW15AN1N5B00D_C18221.html
footprint IND-0402 (0402 (1005M) Inductor)
pins: 1, 2

## LQW15AN1N5C00D
designator L?  Inductance: 1.5nH
Inductor, 1.5nH, 30mΩ, 1A, SMD 0402; Manufacturer: Murata Electronics; Manufacturer Part Number: LQW15AN1N5C00D; Self-Resonant Frequency: 18GHz; Q Factor: 10@250MHz; Package Size: 0402; JLCPCB Basic Part: No; JLCPCB Part Number: C167468; Supplier 1: LCSC; Category: Inductors; Supplier Part Number 1: C167468; Rated Current: 1A; DC Resistance: 30mΩ; RoHS: Yes; ComponentLink1Description: Datasheet; ComponentLink1URL: https://wmsc.lcsc.com/wmsc/upload/file/pdf/v2/lcsc/2304140030_Murata-Electronics-LQW15AN1N5C00D_C167468.pdf; ComponentLink2Description: JLCPCB Part URL; ComponentLink2URL: https://jlcpcb.com/partdetail/C167468; ComponentLink3Description: LCSC Part URL; ComponentLink3URL: https://lcsc.com/product-detail/Inductors-SMD_Murata-Electronics-Murata-Electronics-LQW15AN1N5C00D_C167468.html
footprint IND-0402 (0402 (1005M) Inductor)
pins: 1, 2

## LQW15AN1N5C80D
designator L?  Inductance: 1.5nH
Inductor, 1.5nH, 28mΩ, 2.1A, SMD 0402; Manufacturer: Murata Electronics; Manufacturer Part Number: LQW15AN1N5C80D; Self-Resonant Frequency: 18GHz; Q Factor: 20@250MHz; Package Size: 0402; JLCPCB Basic Part: No; JLCPCB Part Number: C412261; Supplier 1: LCSC; Category: Inductors; Supplier Part Number 1: C412261; Rated Current: 2.1A; DC Resistance: 28mΩ; RoHS: Yes; ComponentLink1Description: Datasheet; ComponentLink1URL: https://wmsc.lcsc.com/wmsc/upload/file/pdf/v2/lcsc/2304140030_Murata-Electronics-LQW15AN1N5C80D_C412261.pdf; ComponentLink2Description: JLCPCB Part URL; ComponentLink2URL: https://jlcpcb.com/partdetail/C412261; ComponentLink3Description: LCSC Part URL; ComponentLink3URL: https://lcsc.com/product-detail/Inductors-SMD_Murata-Electronics-Murata-Electronics-LQW15AN1N5C80D_C412261.html
footprint IND-0402 (0402 (1005M) Inductor)
pins: 1, 2

## LQW15AN1N6C00D
designator L?  Inductance: 1.6nH
Inductor, 1.6nH, 70mΩ, SMD 0402; Manufacturer: Murata Electronics; Manufacturer Part Number: LQW15AN1N6C00D; Self-Resonant Frequency: 17GHz; Q Factor: 10@250MHz; Package Size: 0402; JLCPCB Basic Part: No; JLCPCB Part Number: C341686; Supplier 1: LCSC; Category: Inductors; Supplier Part Number 1: C341686; DC Resistance: 70mΩ; RoHS: Yes; ComponentLink1Description: Datasheet; ComponentLink1URL: https://wmsc.lcsc.com/wmsc/upload/file/pdf/v2/lcsc/2304140030_Murata-Electronics-LQW15AN1N6C00D_C341686.pdf; ComponentLink2Description: JLCPCB Part URL; ComponentLink2URL: https://jlcpcb.com/partdetail/C341686; ComponentLink3Description: LCSC Part URL; ComponentLink3URL: https://lcsc.com/product-detail/Inductors-SMD_Murata-Electronics-Murata-Electronics-LQW15AN1N6C00D_C341686.html
footprint IND-0402 (0402 (1005M) Inductor)
pins: 1, 2

## LQW15AN1N7C80D
designator L?  Inductance: 1.7nH
Inductor, 1.7nH, 65mΩ, SMD 0402; Manufacturer: Murata Electronics; Manufacturer Part Number: LQW15AN1N7C80D; Self-Resonant Frequency: 18GHz; Q Factor: 20@250MHz; Package Size: 0402; JLCPCB Basic Part: No; JLCPCB Part Number: C412263; Supplier 1: LCSC; Category: Inductors; Supplier Part Number 1: C412263; DC Resistance: 65mΩ; RoHS: Yes; ComponentLink1Description: Datasheet; ComponentLink1URL: https://wmsc.lcsc.com/wmsc/upload/file/pdf/v2/lcsc/2304140030_Murata-Electronics-LQW15AN1N7C80D_C412263.pdf; ComponentLink2Description: JLCPCB Part URL; ComponentLink2URL: https://jlcpcb.com/partdetail/C412263; ComponentLink3Description: LCSC Part URL; ComponentLink3URL: https://lcsc.com/product-detail/Inductors-SMD_Murata-Electronics-Murata-Electronics-LQW15AN1N7C80D_C412263.html
footprint IND-0402 (0402 (1005M) Inductor)
pins: 1, 2

## LQW15AN1N8C00D
designator L?  Inductance: 1.8nH
Inductor, 1.8nH, 160mΩ, 460mA, SMD 0402; Manufacturer: Murata Electronics; Manufacturer Part Number: LQW15AN1N8C00D; Package Size: 0402; JLCPCB Basic Part: No; JLCPCB Part Number: C703123; Supplier 1: LCSC; Category: Inductors; Supplier Part Number 1: C703123; Rated Current: 460mA; DC Resistance: 160mΩ; RoHS: Yes; ComponentLink1Description: Datasheet; ComponentLink1URL: https://wmsc.lcsc.com/wmsc/upload/file/pdf/v2/lcsc/2304140030_Murata-Electronics-LQW15AN1N8C00D_C703123.pdf; ComponentLink2Description: JLCPCB Part URL; ComponentLink2URL: https://jlcpcb.com/partdetail/C703123; ComponentLink3Description: LCSC Part URL; ComponentLink3URL: https://lcsc.com/product-detail/Power-Inductors_Murata-Electronics-Murata-Electronics-LQW15AN1N8C00D_C703123.html
footprint IND-0402 (0402 (1005M) Inductor)
pins: 1, 2
